# Altium footprint library CONN_USB.PcbLib: 28 footprints (part 1 of 2)
Each footprint in its own frame and in the unit in brackets; x right, y up, seen from the top. Pads: shape width x height; smd on the part's side, far side on the other; paste and mask are expansions set on the pad; w line width, h text height; cw(c..) or ccw(c..) is an arc to the next point about the centre after c.
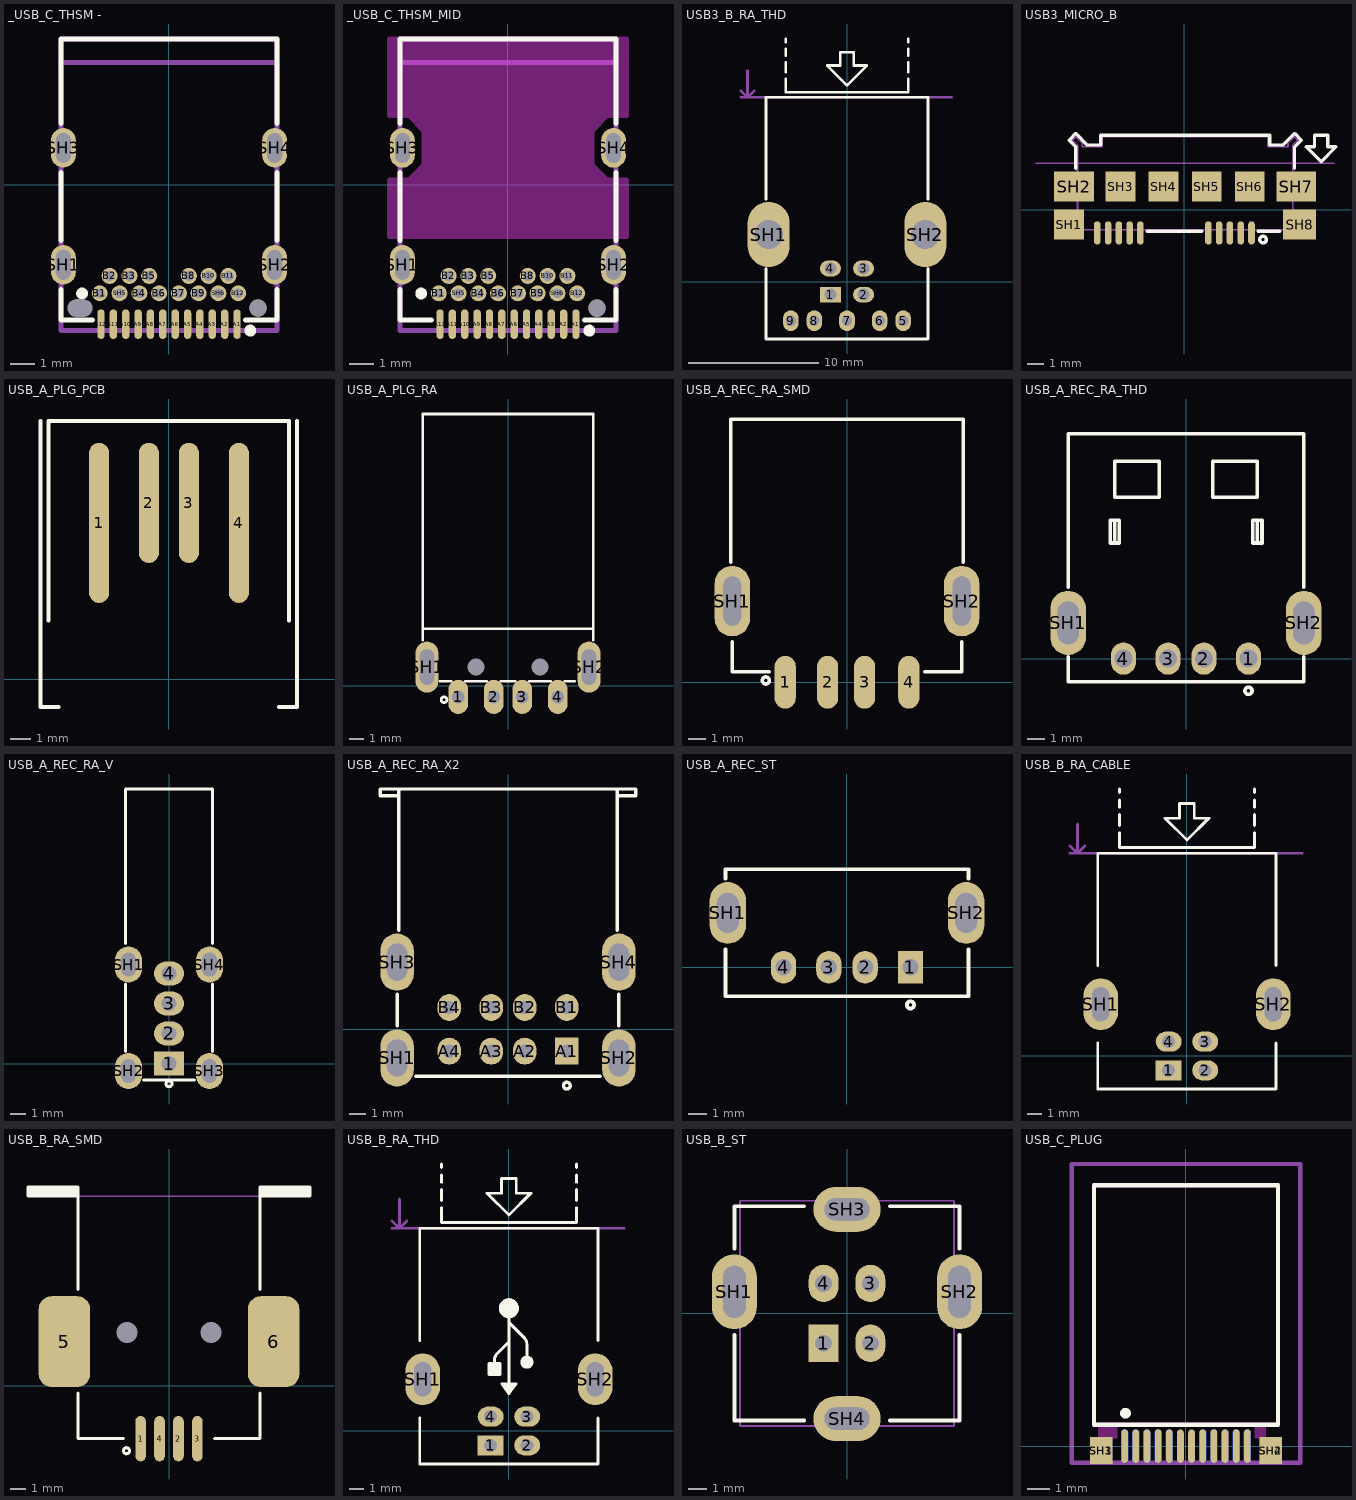
[diagram p0: the footprints below, top view; thin cyan lines are the x and y axes]

## _USB_C_THSM - [mm] "USB 3.1 Type C Receptacle Horizontal THR"
height 2.96
pads (32):
  oval 0.3x1.2 smd mask+0.075: A1(2.75,-5.635) A2(2.25,-5.635) A3(1.75,-5.635) A4(1.25,-5.635) A5(0.75,-5.635) A6(0.25,-5.635) A7(-0.25,-5.635) A8(-0.75,-5.635) A9(-1.25,-5.635) A10(-1.75,-5.635) A11(-2.25,-5.635) A12(-2.75,-5.635)
  round 0.65 hole 0.4: B1(-2.8,-4.385) B2(-2.4,-3.685) B3(-1.6,-3.685) B4(-1.2,-4.385) B5(-0.8,-3.685) B6(-0.4,-4.385) B7(0.4,-4.385) B8(0.8,-3.685) B9(1.2,-4.385) B10(1.6,-3.685) B11(2.4,-3.685) B12(2.8,-4.385) SH5(-2,-4.385) SH6(2,-4.385)
  oval 1x1.6 hole 0.6 slot 1.2 at 90 deg: SH1(-4.27,-3.235) SH2(4.27,-3.235) SH3(-4.27,1.495) SH4(4.27,1.495)
  oval 0.9x0.7 hole 0.7 slot 1 at 0 deg unplated: ""(-3.6,-4.985)
  round 0.7 hole 0.7 unplated: ""(3.6,-4.985)
Top Overlay:
  circle w0.25: c3.288,-5.895 r0.114
  circle w0.25: c-3.512,-4.395 r0.114
  lines w0.2: -4.37,-4.225 -4.37,-5.465 -3.1,-5.465 ; -4.37,-2.245 -4.37,0.495 ; -4.37,2.485 -4.37,5.895 4.37,5.895 4.37,2.485 ; 3.1,-5.465 4.37,-5.465 4.37,-4.225 ; 4.37,-2.245 4.37,0.495
Mechanical 13:
  lines w0.2: -4.37,-5.895 4.37,-5.895 4.37,5.895 -4.37,5.895 -4.37,-5.895
Mechanical 15:
  lines w0.2: -4.37,4.945 4.37,4.945
3D body "1054500101.stp": height 1.58, standoff -2.38, extent -4.47,-2.13 4.47,5.77

## _USB_C_THSM_MID [mm] "USB 3.1 Type C Receptacle Horizontal THR, MID-Mount"
height 2.96
pads (31):
  oval 0.3x1.2 smd mask+0.075: A1(2.75,-5.635) A2(2.25,-5.635) A3(1.75,-5.635) A4(1.25,-5.635) A5(0.75,-5.635) A6(0.25,-5.635) A7(-0.25,-5.635) A8(-0.75,-5.635) A9(-1.25,-5.635) A10(-1.75,-5.635) A11(-2.25,-5.635) A12(-2.75,-5.635)
  round 0.65 hole 0.4: B1(-2.8,-4.385) B2(-2.4,-3.685) B3(-1.6,-3.685) B4(-1.2,-4.385) B5(-0.8,-3.685) B6(-0.4,-4.385) B7(0.4,-4.385) B8(0.8,-3.685) B9(1.2,-4.385) B10(1.6,-3.685) B11(2.4,-3.685) B12(2.8,-4.385) SH5(-2,-4.385) SH6(2,-4.385)
  oval 1x1.6 hole 0.6 slot 1.2 at 90 deg: SH1(-4.27,-3.235) SH2(4.27,-3.235) SH3(-4.27,1.495) SH4(4.27,1.495)
  round 0.7 hole 0.7 unplated: ""(3.6,-4.985)
Top Overlay:
  circle w0.25: c3.288,-5.895 r0.114
  circle w0.25: c-3.512,-4.395 r0.114
  lines w0.2: -4.37,-4.225 -4.37,-5.465 -3.1,-5.465 ; -4.37,-2.245 -4.37,0.495 ; -4.37,2.485 -4.37,5.895 4.37,5.895 4.37,2.485 ; 3.1,-5.465 4.37,-5.465 4.37,-4.225 ; 4.37,-2.245 4.37,0.495
Keep-Out Layer:
  board cut-out: -4.75,-2.1 -4.75,0.2 -4,0.2 -3.4,0.8 -3.4,2.2 -4,2.8 -4.75,2.8 -4.75,5.9 4.75,5.9 4.75,2.8 4,2.8 3.4,2.2 3.4,0.8 4,0.2 4.75,0.2 4.75,-2.1
  lines w0.2: -4.8,-2.1 -4.8,0.2 -4,0.2 -3.4,0.8 -3.4,2.2 -4,2.8 -4.8,2.8 -4.8,5.9 4.8,5.9 4.8,2.8 4,2.8 3.4,2.2 3.4,0.8 4,0.2 4.8,0.2 4.8,-2.1 -4.8,-2.1
Mechanical 13:
  lines w0.2: -4.37,-5.895 4.37,-5.895 4.37,5.895 -4.37,5.895 -4.37,-5.895
Mechanical 15:
  lines w0.2: -4.37,4.945 4.37,4.945
3D body "632723100011.stp": height 3.05, standoff -1.41, extent -4.37,-5.899 4.37,5.895

## USB3_B_RA_THD [mm] "CONN, USB3.0, TYPE B, THD"
pads (11):
  rect 1.6x1.2 hole 0.9: 1(-1.27,-1)
  oval 1.6x1.2 hole 0.9: 2(1.27,-1) 3(1.27,1) 4(-1.27,1)
  oval 1.2x1.6 hole 0.8: 5(4.3,-3) 6(2.5,-3) 7(0,-3) 8(-2.5,-3) 9(-4.3,-3)
  oval 3.2x5 hole 2.2: SH1(-6,3.6) SH2(6,3.6)
Top Overlay:
  lines w0.2: -6.2,1 -6.2,-4.4 6.2,-4.4 6.2,1 ; -6.2,6.3 -6.2,14.1 6.2,14.1 6.2,6.3 ; -4.699,15.524 -4.699,14.508 4.699,14.508 4.699,15.524 ; -4.699,16.032 -4.699,16.794 ; -4.699,17.302 -4.699,17.81 ; -4.699,18.318 -4.699,18.572 ; 4.699,16.032 4.699,16.794 ; 4.699,17.302 4.699,17.81 ; 4.699,18.318 4.699,18.572 ; -1.524,16.54 -0.508,16.54 -0.508,17.556 0.508,17.556 0.508,16.54 1.524,16.54 0,15.016 -1.524,16.54
Mechanical 1:
  lines w0.2: -8.128,14.1 8.001,14.1 ; -8.128,14.608 -7.62,14.1 ; -7.62,16.132 -7.62,14.1 ; -7.112,14.608 -7.62,14.1
  text "Edge of Board" at -6.6,14.8 h1
3D body "usb3type-b.stp": height 13.2, standoff -2.36, extent -7.199,-4.3 7.199,14

## USB3_MICRO_B [mm] "CONN, USB3, Micro B, CMS1811-010010 (HOSIDEN), GSB343133HR (AMPHENOL)"
pads (18):
  oval 0.4x1.4 smd: 1(4.05,-1.4) 2(3.4,-1.4) 3(2.75,-1.4) 4(2.1,-1.4) 5(1.45,-1.4) 6(-2.65,-1.4) 7(-3.3,-1.4) 8(-3.95,-1.4) 9(-4.6,-1.4) 10(-5.25,-1.4)
  rect 1.8x1.8 smd: SH1(-6.95,-0.9) SH3(-3.85,1.4) SH4(-1.25,1.4) SH5(1.35,1.4) SH6(3.95,1.4)
  rect 2.4x1.8 smd: SH2(-6.65,1.4) SH7(6.75,1.4)
  rect 2x1.8 smd: SH8(6.95,-0.9)
Top Overlay:
  circle w0.2: c4.75,-1.8 r0.2
  lines w0.2: -6.55,2.5 -6.55,3.8 -6.95,4.2 ; -2.25,-1.3 1.05,-1.3 ; 4.45,-1.3 5.75,-1.3 ; 6.65,2.5 6.65,3.8 7.05,4.2 6.65,4.6 5.95,3.9 5.15,3.9 5.15,4.5 -5.05,4.5 -5.05,3.9 -5.85,3.9 -6.55,4.6 ; -6.95,4.2 -6.95,4.2 ; -6.95,4.2 -6.55,4.6 ; -6.55,4.6 -6.55,4.6 ; 7.35,3.8 7.85,3.8 7.85,4.5 8.65,4.5 8.65,3.8 9.15,3.8 8.25,2.9 7.35,3.8
Mechanical 1:
  lines w0.1: -8.95,2.8 9.05,2.8
  text "PCB EDGE" at 9.25,2.4 h0.8
Mechanical 13:
  lines w0.1: -7.35,0.9 -6.45,0.9 -6.45,-1.2 6.55,-1.2 6.55,0.9 6.85,0.9 6.85,1.9 6.55,1.9 6.55,3.9 6.85,4.2 6.65,4.4 6.25,4 6.25,3.8 5.05,3.8 5.05,4.4 -4.95,4.4 -4.95,3.8 -6.15,3.8 -6.15,4 -6.55,4.4 -6.75,4.2 -6.45,3.9 -6.45,1.9 -7.35,1.9 -7.35,0.9
3D body: height 2.8, standoff 0, extent -7.35,-1.2 6.85,4.4

## USB_A_PLG_PCB [mm]
height 6.5
pads (4):
  oval 1x8 smd: 1(-3.485,7.8) 4(3.5,7.8)
  oval 1x6 smd: 2(-1,8.8) 3(1,8.8)
Top Overlay:
  lines w0.2: -6.4,12.9 -6.4,-1.4 -5.5,-1.4 ; -6,2.933 -6,12.9 6,12.9 6,2.933 ; 5.5,-1.4 6.4,-1.4 6.4,12.9

## USB_A_PLG_RA [mm] "CONN, USB, Type A, PLUG, Right Angle, SMD, THD"
height 4.5
pads (8):
  oval 1.4x2.4 / inner oval 1.4x1.8 / far side oval 1.4x1.8 hole 0.9 mask+0.1: 1(-3.5,-0.8) 2(-1,-0.8) 3(1,-0.8) 4(3.5,-0.8)
  oval 1.6x3.6 hole 1 slot 2.5 at 90 deg: SH1(-5.7,1.3) SH2(5.7,1.3)
  round 0.8 hole 1.2 unplated: ""(-2.25,1.3) ""(2.25,1.3)
Top Overlay:
  circle w0.2: c-4.5,-1 r0.2
  lines w0.2: -6,3.2 -6,19.1 6,19.1 6,3.2 ; -6,4 6,4 ; -4.8,0.3 -4,0.3 ; -3,0.3 -1.5,0.3 ; -0.5,0.3 0.5,0.3 ; 1.5,0.3 3,0.3 ; 4,0.3 4.7,0.3
Mechanical 1:
  lines w0.1: -6,4 6,4
  text "PCB Edge" at 5.173,4.473 h0.25
3D body "14381.STEP": height 3.13, standoff -2.67, extent -6.303,-1.3 6.303,19

## USB_A_REC_RA_SMD [mm] "CONN, USB A, Receptacle, RIGHT ANGLE, SMD"
pads (6):
  oval 1.2x3 smd: 1(-3.5,0) 2(-1.1,0) 3(1,0) 4(3.5,0)
  oval 2x4 hole 1 slot 2.8 at 90 deg: SH1(-6.5,4.6) SH2(6.5,4.6)
Top Overlay:
  circle w0.2: c-4.6,0.1 r0.2
  lines w0.2: -6.6,6.8 -6.6,14.9 6.6,14.9 6.6,6.8 ; -6.5,2.3 -6.5,0.6 -4.4,0.6 ; 4.4,0.6 6.5,0.6 6.5,2.3
3D body "USB MADEGI SMD .stp": height 7.7, standoff -2.62, extent -7.3,-0.206 7.2,14.806

## USB_A_REC_RA_THD [mm] "CONN, USB A, Receptacle, RIGHT ANGLE, THD"
height 7
pads (6):
  oval 1.4x1.8 hole 1: 1(3.5,0) 2(1,0) 3(-1,0) 4(-3.5,0)
  oval 2x3.6 hole 1.2 slot 2.4 at 90 deg: SH1(-6.6,2) SH2(6.6,2)
Top Overlay:
  circle w0.2: c3.5,-1.8 r0.2
  lines w0.2: -6.6,0.1 -6.6,-1.3 6.6,-1.3 6.6,0.1 ; -6.6,4 -6.6,12.6 6.6,12.6 6.6,4 ; -3.995,6.475 -4.249,6.475 -4.249,7.745 -3.995,7.745 ; -3.995,6.475 -3.741,6.475 -3.741,7.745 -3.995,7.745 ; -3.995,6.475 -3.995,7.745 ; 4,6.475 3.746,6.475 3.746,7.745 4,7.745 ; 4,6.475 4.255,6.475 4.255,7.745 4,7.745 ; 4,6.475 4,7.745 ; -3.995,9.047 -3.995,11.047 -1.495,11.047 -1.495,9.047 -3.995,9.047 ; 1.5,9.047 1.5,11.047 4,11.047 4,9.047 1.5,9.047
3D body "User Library-USB-A-01.step": height 6.95, standoff -4.2, extent -7.9,-1.2 7.9,12.5

## USB_A_REC_RA_V [mm] "CONN, USB A, Right Angle, VERTICAL, THD"
height 13.83
pads (8):
  rect 2x1.6 hole 1: 1(0,0)
  oval 2x1.6 hole 1: 2(0,2) 3(0,4) 4(0,6)
  oval 1.8x2.4 hole 1 slot 1.6 at 90 deg: SH1(-2.7,6.6) SH2(-2.7,-0.5) SH3(2.7,-0.5) SH4(2.7,6.6)
Top Overlay:
  circle w0.2: c0,-1.35 r0.2
  lines w0.2: -2.9,0.8 -2.9,5.3 ; -2.9,8 -2.9,18.3 2.9,18.3 2.9,8 ; -1.7,-1.1 1.7,-1.1 ; 2.9,0.8 2.9,5.3
3D body "usb_a-usb_a-e.stp": height 14.25, standoff -3.9, extent -3.556,-1.025 3.564,18.225

## USB_A_REC_RA_X2 [mm] "CONN, USB A, Right Angle, DUAL"
height 15.82
pads (12):
  rect 1.4x1.6 hole 0.8: A1(3.5,-1.3)
  oval 1.4x1.6 hole 0.8: A2(1,-1.3) A3(-1,-1.3) A4(-3.5,-1.3) B1(3.5,1.3) B2(1,1.3) B3(-1,1.3) B4(-3.5,1.3)
  oval 2x3.4 hole 1.2 slot 2.2 at 90 deg: SH1(-6.6,-1.7) SH2(6.6,-1.7) SH3(-6.6,4) SH4(6.6,4)
Top Overlay:
  circle w0.2: c3.5,-3.35 r0.2
  lines w0.2: -6.6,0.2 -6.6,2.1 ; -6.5,5.9 -6.5,14.3 ; -6.5,13.9 -7.6,13.9 -7.6,14.3 -6.5,14.3 ; -5.5,-2.8 5.5,-2.8 ; 6.5,5.9 6.5,14.3 ; 6.5,13.9 7.6,13.9 7.6,14.3 6.5,14.3 ; 6.6,0.2 6.6,2.1 ; -6.5,14.3 6.5,14.3
Mechanical 1:
  lines w0.1: -6.57,14.3 6.57,14.3
  text "PCB Edge" at 6.15,13.932 h0.2
3D body "14378.STEP": height 16.3, standoff -3.1, extent -7.851,-2.7 7.849,14.898

## USB_A_REC_ST [mm] "CONN, USB A, Receptacle, STRAIGHT, THD"
height 15
pads (6):
  rect 1.4x1.8 hole 0.9: 1(3.5,0)
  oval 1.4x1.8 hole 0.9: 2(1,0) 3(-1,0) 4(-3.5,0)
  oval 2x3.4 hole 1.2 slot 2.2 at 90 deg: SH1(-6.57,3) SH2(6.57,3)
Top Overlay:
  circle w0.2: c3.5,-2.075 r0.2
  lines w0.2: -6.7,1 -6.7,-1.6 6.7,-1.6 6.7,1 ; -6.7,4.9 -6.7,5.4 6.7,5.4 6.7,4.9
3D body "14382.STEP": height 14, standoff -3.99, extent -7.992,-2.365 7.992,5.275

## USB_B_RA_CABLE [mm] "CONN, USB B, Receptacle, RIGHT ANGLE, THD"
height 11.1
pads (6):
  rect 1.8x1.4 hole 0.9: 1(-1.27,-1)
  oval 1.8x1.4 hole 0.9: 2(1.27,-1) 3(1.27,1) 4(-1.27,1)
  oval 2.4x3.6 hole 1.2 slot 2.4 at 90 deg: SH1(-6,3.6) SH2(6,3.6)
Top Overlay:
  lines w0.2: -6.2,0.9 -6.2,-2.3 6.2,-2.3 6.2,0.9 ; -6.2,6.3 -6.2,14.1 6.2,14.1 6.2,6.3 ; -4.699,15.524 -4.699,14.508 4.699,14.508 4.699,15.524 ; -4.699,16.032 -4.699,16.794 ; -4.699,17.302 -4.699,17.81 ; -4.699,18.318 -4.699,18.572 ; 4.699,16.032 4.699,16.794 ; 4.699,17.302 4.699,17.81 ; 4.699,18.318 4.699,18.572 ; -1.524,16.54 -0.508,16.54 -0.508,17.556 0.508,17.556 0.508,16.54 1.524,16.54 0,15.016 -1.524,16.54
Mechanical 1:
  lines w0.2: -8.128,14.1 8.001,14.1 ; -8.128,14.608 -7.62,14.1 ; -7.62,16.132 -7.62,14.1 ; -7.112,14.608 -7.62,14.1
  text "Edge of Board" at -6.6,14.8 h1
3D body "Samtec-DEFAULT.STEP": height 11.05, standoff 0.55, extent -5.575,2.582 5.625,68.532
3D body "User Library-Samtec - USB-B-S-X-W-TH.STEP": height 11.1, standoff -3.54, extent -7.454,-2.522 7.345,13.978

## USB_B_RA_SMD [mm] "CONN, USB B, Receptacle, RIGHT ANGLE, SMD"
height 11
pads (8):
  oval 0.7x3 smd mask+0.075: 1(-1.875,-3.5) 2(0.625,-3.5) 3(1.875,-3.5) 4(-0.625,-3.5)
  rrect50% 3.4x6 smd: 5(-6.9,2.9) 6(6.9,2.9)
  round 1.1 hole 1.4 unplated: ""(-2.775,3.5) ""(2.775,3.5)
Top Overlay:
  circle w0.2: c-2.8,-4.3 r0.2
  region: -6.02,12.5 -6.02,13.1 -9.32,13.1 -9.32,12.5
  region: 9.32,12.5 9.32,13.1 6.02,13.1 6.02,12.5
  lines w0.2: -6.02,-0.5 -6.02,-3.5 -3,-3.5 ; -6.02,6.34 -6.02,12.5 ; 3,-3.5 6.02,-3.5 6.02,-0.5 ; 6.02,6.34 6.02,12.5 ; -6.02,12.5 -9.32,12.5 -9.32,13.1 -6.02,13.1 -6.02,12.5 ; 6.02,12.5 9.32,12.5 9.32,13.1 6.02,13.1 6.02,12.5
Mechanical 1:
  lines w0.1: -6.02,12.5 6.02,12.5
  text "PCB Edge" at 5.75,12.281 h0.25
3D body "Samtec-DEFAULT.STEP": height 11.05, standoff 0.55, extent -5.702,3.305 5.498,69.255
3D body "14383.STEP": height 11, standoff -1.5, extent -8.097,-4.635 8.103,12.515

## USB_B_RA_THD [mm] "CONN, USB B, Receptacle, RIGHT ANGLE, THD"
pads (6):
  rect 1.8x1.4 hole 0.9: 1(-1.27,-1)
  oval 1.8x1.4 hole 0.9: 2(1.27,-1) 3(1.27,1) 4(-1.27,1)
  oval 2.4x3.6 hole 1.2 slot 2.4 at 90 deg: SH1(-6,3.6) SH2(6,3.6)
Top Overlay:
  circle w0.889: c0,8.535 r0.254
  circle w0.508: c1.25,4.785 r0.2
  region: 0,2.585 -0.5,3.285 0.5,3.285
  region: -1.375,3.935 -1.375,4.685 -0.625,4.685 -0.625,3.935
  lines w0.2: -6.2,0.9 -6.2,-2.3 6.2,-2.3 6.2,0.9 ; -6.2,6.3 -6.2,14.1 6.2,14.1 6.2,6.3 ; -4.699,15.524 -4.699,14.508 4.699,14.508 4.699,15.524 ; -4.699,16.032 -4.699,16.794 ; -4.699,17.302 -4.699,17.81 ; -4.699,18.318 -4.699,18.572 ; -1,4.685 -1,4.935 cw(c-0.36,4.935) -0.812,5.388 -0.062,6.138 ; 0,3.285 0,8.035 ; 0.062,7.488 1.062,6.488 cw(c0.61,6.035) 1.25,6.035 1.25,4.785 ; 4.699,16.032 4.699,16.794 ; 4.699,17.302 4.699,17.81 ; 4.699,18.318 4.699,18.572 ; -1.524,16.54 -0.508,16.54 -0.508,17.556 0.508,17.556 0.508,16.54 1.524,16.54 0,15.016 -1.524,16.54 ; -1.375,3.935 -1.375,4.685 -0.625,4.685 -0.625,3.935 -1.375,3.935 ; -0.5,3.285 0,2.585 0.5,3.285 -0.5,3.285
Mechanical 1:
  lines w0.2: -8.128,14.1 8.001,14.1 ; -8.128,14.608 -7.62,14.1 ; -7.62,16.132 -7.62,14.1 ; -7.112,14.608 -7.62,14.1
  text "Edge of Board" at -6.6,14.8 h1
3D body "User Library-Samtec - USB-B-S-X-W-TH.STEP": height 11.1, standoff -3.54, extent -7.454,-2.522 7.345,13.978

## USB_B_ST [mm] "CONN, USB B, Receptacle, STRAIGHT, THD"
height 15.62
pads (8):
  rect 1.6x2 hole 0.9: 1(-1.25,-1.6)
  oval 1.6x2 hole 0.9: 2(1.25,-1.6) 3(1.25,1.6) 4(-1.25,1.6)
  oval 2.4x4 hole 1.2 slot 2.8 at 90 deg: SH1(-6.02,1.15) SH2(6.02,1.15)
  oval 3.6x2.4 hole 1.2 slot 2.4 at 0 deg: SH3(0,5.56) SH4(0,-5.63)
Top Overlay:
  lines w0.2: -6.02,-1.15 -6.02,-5.73 -2.3,-5.73 ; -6.02,3.45 -6.02,5.73 -2.3,5.73 ; 2.3,-5.73 6.02,-5.73 6.02,-1.15 ; 2.3,5.73 6.02,5.73 6.02,3.45
Mechanical 13:
  lines w0.1: -5.73,-6.02 5.73,-6.02 5.73,6.02 -5.73,6.02 -5.73,-6.02
3D body "5881.STEP": height 15.8, standoff -4.74, extent -7.55,-5.65 7.548,5.85

## USB_C_PLUG [mm] "CONN, USB C , PLUG"
pads (26):
  oval 0.3x1.5 smd mask+0.075: A1(-2.75,0) A2(-2.25,0) A3(-1.75,0) A4(-1.25,0) A5(-0.75,0) A6(-0.25,0) A7(0.25,0) A8(0.75,0) A9(1.25,0) A10(1.75,0) A11(2.25,0) A12(2.75,0)
  oval 0.3x1.5 smd far side mask+0.075: B1(2.75,0) B2(2.25,0) B3(1.75,0) B4(1.25,0) B5(0.75,0) B8(-0.75,0) B9(-1.25,0) B10(-1.75,0) B11(-2.25,0) B12(-2.75,0)
  rect 1x1.2 smd: SH1(-3.8,-0.2) SH2(3.8,-0.2)
  rect 1x1.2 smd far side: SH3(-3.8,-0.2) SH4(3.8,-0.2)
Top Overlay:
  circle w0.25: c-2.712,1.475 r0.114
  lines w0.2: -4.125,0.95 -4.125,11.7 4.125,11.7 4.125,0.95 -4.125,0.95
Bottom Overlay:
  circle w0.25: c2.712,1.475 r0.114
  lines w0.2: -4.125,0.95 -4.125,11.7 4.125,11.7 4.125,0.95 -4.125,0.95
Keep-Out Layer:
  board cut-out: 3.58,0.95 3.58,0.35 3.08,0.35 3.08,0.95
  board cut-out: -3.075,0.95 -3.075,0.35 -3.945,0.35 -3.945,0.95
  lines w0.2: -4.125,0.95 -4.125,11.7 4.125,11.7 4.125,0.95 -4.125,0.95
Mechanical 13:
  lines w0.2: -5.125,-0.75 -5.125,12.65 5.125,12.65 5.125,-0.75 -5.125,-0.75
3D body "632712000011.stp": height 1.9, standoff -2.3, extent -5.125,-0.75 5.125,12.65